# Altium footprint library JL_PCB.PCBLIB: 1129 footprints (part 36 of 72)
Each footprint in its own frame and in the unit in brackets; x right, y up, seen from the top. Pads: shape width x height; smd on the part's side, far side on the other; paste and mask are expansions set on the pad; w line width, h text height; cw(c..) or ccw(c..) is an arc to the next point about the centre after c.
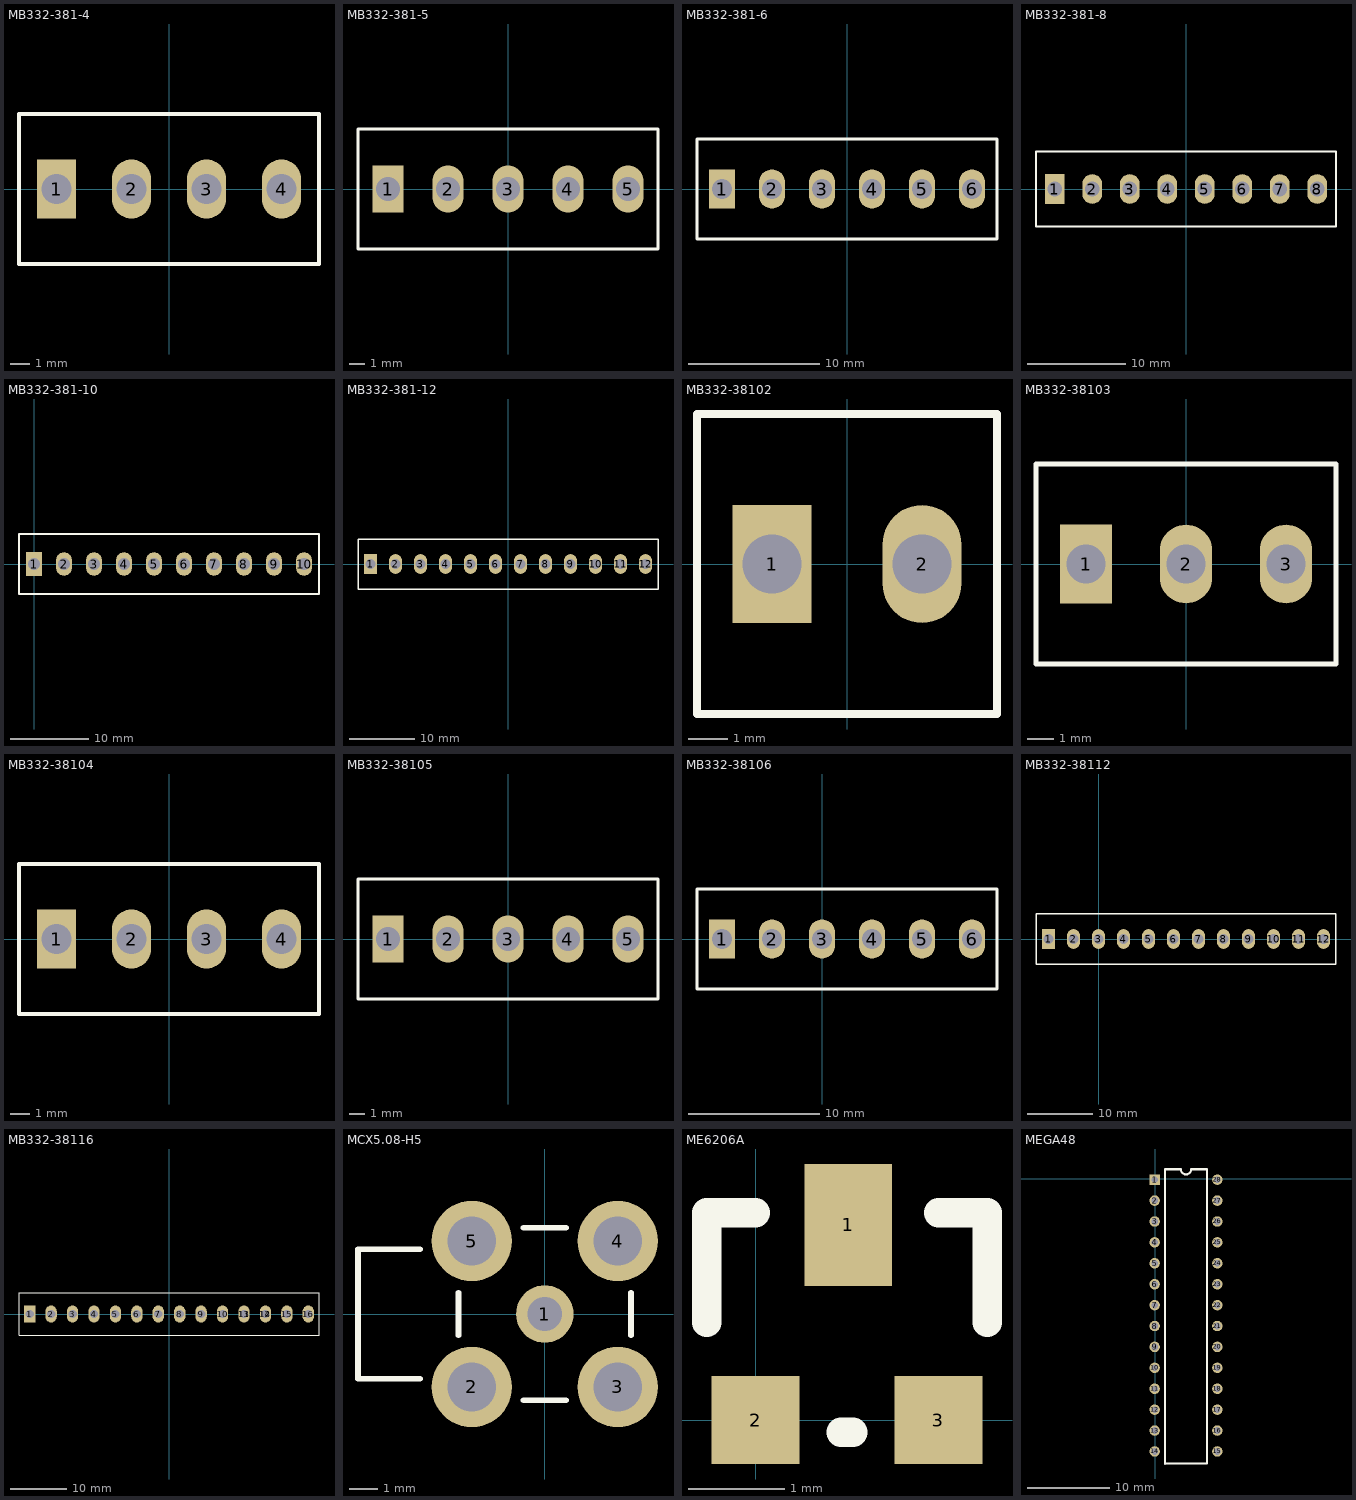
[diagram p35: the footprints below, top view; thin cyan lines are the x and y axes]

## MB332-381-4 [mm]
pads (4):
  rect 2x3 hole 1.5: 1(-5.715,0)
  oval 2x3 hole 1.5: 2(-1.905,0) 3(1.905,0) 4(5.715,0)
TopOverlay:
  lines w0.2: -7.62,-3.81 -7.62,3.81 7.62,3.81 7.62,-3.81 -7.62,-3.81

## MB332-381-5 [mm]
pads (5):
  rect 2x3 hole 1.5: 1(-7.62,0)
  oval 2x3 hole 1.5: 2(-3.81,0) 3(0,0) 4(3.81,0) 5(7.62,0)
TopOverlay:
  lines w0.2: -9.525,-3.81 -9.525,3.81 9.525,3.81 9.525,-3.81 -9.525,-3.81

## MB332-381-6 [mm]
pads (6):
  rect 2x3 hole 1.5: 1(-9.525,0)
  oval 2x3 hole 1.5: 2(-5.715,0) 3(-1.905,0) 4(1.905,0) 5(5.715,0) 6(9.525,0)
TopOverlay:
  lines w0.2: -11.43,-3.81 -11.43,3.81 11.43,3.81 11.43,-3.81 -11.43,-3.81

## MB332-381-8 [mm]
pads (8):
  rect 2x3 hole 1.5: 1(-13.335,0)
  oval 2x3 hole 1.5: 2(-9.525,0) 3(-5.715,0) 4(-1.905,0) 5(1.905,0) 6(5.715,0) 7(9.525,0) 8(13.335,0)
TopOverlay:
  lines w0.2: -15.24,-3.81 15.24,-3.81 15.24,3.81 -15.24,3.81 -15.24,-3.81

## MB332-381-10 [mm]
pads (10):
  rect 2x3 hole 1.5: 1(0,0)
  oval 2x3 hole 1.5: 2(3.81,0) 3(7.62,0) 4(11.43,0) 5(15.24,0) 6(19.05,0) 7(22.86,0) 8(26.67,0) 9(30.48,0) 10(34.29,0)
TopOverlay:
  lines w0.2: -1.905,-3.81 36.195,-3.81 36.195,3.81 -1.905,3.81 -1.905,-3.81

## MB332-381-12 [mm]
pads (12):
  rect 2x3 hole 1.5: 1(-20.955,0)
  oval 2x3 hole 1.5: 2(-17.145,0) 3(-13.335,0) 4(-9.525,0) 5(-5.715,0) 6(-1.905,0) 7(1.905,0) 8(5.715,0) 9(9.525,0) 10(13.335,0) 11(17.145,0) 12(20.955,0)
TopOverlay:
  lines w0.2: -22.86,-3.81 -22.86,3.81 22.86,3.81 22.86,-3.81 -22.86,-3.81

## MB332-38102 [mm]
pads (2):
  rect 2x3 hole 1.5: 1(-1.905,0)
  oval 2x3 hole 1.5: 2(1.905,0)
TopOverlay:
  lines w0.2: -3.81,-3.81 3.81,-3.81 3.81,3.81 -3.81,3.81 -3.81,-3.81

## MB332-38103 [mm]
pads (3):
  rect 2x3 hole 1.5: 1(-3.81,0)
  oval 2x3 hole 1.5: 2(0,0) 3(3.81,0)
TopOverlay:
  lines w0.2: -5.715,-3.81 -5.715,3.81 5.715,3.81 5.715,-3.81 -5.715,-3.81

## MB332-38104 [mm]
pads (4):
  rect 2x3 hole 1.5: 1(-5.715,0)
  oval 2x3 hole 1.5: 2(-1.905,0) 3(1.905,0) 4(5.715,0)
TopOverlay:
  lines w0.2: -7.62,-3.81 -7.62,3.81 7.62,3.81 7.62,-3.81 -7.62,-3.81
3D body "MB332-38104.STEP": height 8.5, standoff -1.9, extent -8.686,-3.722 7.327,3.505

## MB332-38105 [mm]
pads (5):
  rect 2x3 hole 1.5: 1(-7.62,0)
  oval 2x3 hole 1.5: 2(-3.81,0) 3(0,0) 4(3.81,0) 5(7.62,0)
TopOverlay:
  lines w0.2: -9.525,-3.81 9.525,-3.81 9.525,3.81 -9.525,3.81 -9.525,-3.81

## MB332-38106 [mm]
pads (6):
  rect 2x3 hole 1.5: 1(-7.62,0)
  oval 2x3 hole 1.5: 2(-3.81,0) 3(0,0) 4(3.81,0) 5(7.62,0) 6(11.43,0)
TopOverlay:
  lines w0.2: -9.525,-3.81 -9.525,3.81 13.335,3.81 13.335,-3.81 -9.525,-3.81

## MB332-38112 [mm]
pads (12):
  rect 2x3 hole 1.5: 1(-7.62,0)
  oval 2x3 hole 1.5: 2(-3.81,0) 3(0,0) 4(3.81,0) 5(7.62,0) 6(11.43,0) 7(15.24,0) 8(19.05,0) 9(22.86,0) 10(26.67,0) 11(30.48,0) 12(34.29,0)
TopOverlay:
  lines w0.2: -9.525,-3.81 36.19,-3.81 36.19,3.81 -9.525,3.81 -9.525,-3.81

## MB332-38116 [mm]
pads (16):
  rect 2x3 hole 1.5: 1(-24.765,0)
  oval 2x3 hole 1.5: 2(-20.955,0) 3(-17.145,0) 4(-13.335,0) 5(-9.525,0) 6(-5.715,0) 7(-1.905,0) 8(1.905,0) 9(5.715,0) 10(9.525,0) 11(13.335,0) 12(17.145,0) 13(13.335,0) 14(17.145,0) 15(20.955,0) 16(24.765,0)
TopOverlay:
  lines w0.2: -26.67,-3.81 -26.67,3.81 26.67,3.81 26.67,-3.81 -26.67,-3.81

## MCX5.08-H5 [mm] "Connector; RF Coaxial, MCX, Thru-Hole; 5 Position; Right-Angle"
height 5.85
pads (5):
  round 2 hole 1.2: 1(0,0)
  round 2.8 hole 1.7: 2(-2.54,-2.54) 3(2.54,-2.54) 4(2.54,2.54) 5(-2.54,2.54)
TopOverlay:
  lines w0.2: -4.34,-2.25 -6.5,-2.25 -6.5,2.25 -4.34,2.25 ; -3,-0.74 -3,0.74 ; -0.74,-3 0.74,-3 ; -0.74,3 0.74,3 ; 3,-0.74 3,0.74

## ME6206A [mil]
pads (3):
  rect 36x50 smd: 1(38,80)
  rect 36x36 smd: 2(0,0) 3(75,0)
TopOverlay:
  lines w12: -20,40 -20,85 0,85 ; 35,-5 40,-5 ; 75,85 95,85 95,40
3D body "CircuitWorks-SOT-23.step": height 43.91, standoff 0.6, extent -22.05,-4.21 96.06,94.21

## MEGA48 [mil]
pads (28):
  rect 50x50 hole 32: 1(-4,-4)
  round 50 hole 32: 2(-4,-104) 3(-4,-204) 4(-4,-304) 5(-4,-404) 6(-4,-504) 7(-4,-604) 8(-4,-704) 9(-4,-804) 10(-4,-904) 11(-4,-1004) 12(-4,-1104) 13(-4,-1204) 14(-4,-1304) 15(296,-1304) 16(296,-1204) 17(296,-1104) 18(296,-1004) 19(296,-904) 20(296,-804) 21(296,-704) 22(296,-604) 23(296,-504) 24(296,-404) 25(296,-304) 26(296,-204) 27(296,-104) 28(296,-4)
TopOverlay:
  lines w10: 46,-1364 46,46 121,46 ccw(c146,46) 171,46 246,46 246,-1362 46,-1362